# Altium integrated library BS_Altium_Lib.IntLib: 1016 symbols (part 1 of 8)
Pins are listed as number, name and electrical type; pins without a type are passive.

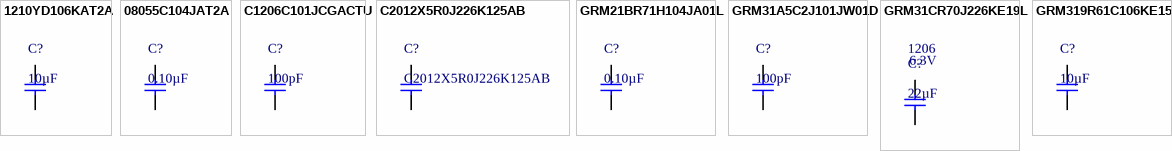
[diagram p0: symbols 1210YD106KAT2A to GRM319R61C106KE15D]

## 1210YD106KAT2A
designator C?, comment 10µF
CAP CER 10UF 16V X5R 1210; Manufacturer: AVX Corporation; Manufacturer Part Number: 1210YD106KAT2A; Tolerance: ±10%; Type: Standard X5R MLCCs; Voltage Rating DC: 16 VDC; Brand: AVX; Class: Class 2; Qualification: Commercial; Supplier 1: Digi-Key; RoHS: RoHS Compliant; Category: Capacitors; Stock 1: 11187; Pricing 1: 1=0.8, 10=0.588, 25=0.504, 50=0.4704, 100=0.4032, 250=0.3696, 500=0.3192 (USD); Packaging: Cut Tape (CT); Part Status: Active; Capacitance: 10µF; Voltage - Rated: 16V; Temperature Coefficient: X5R; Operating Temperature: -55°C ~ 85°C; Features: -; Ratings: -; Applications: General Purpose; Failure Rate: *; Mounting Type: Surface Mount, MLCC; Package / Case: 1210 (3225 Metric); Size / Dimension: 0.126" L x 0.098" W (3.20mm x 2.50mm); Height - Seated (Max): -; Thickness (Max): 0.110" (2.79mm); Lead Spacing: -; Lead Style: -; ComponentLink1URL: http://datasheets.avx.com/cx5r.pdf; ComponentLink1Description: http://datasheets.avx.com/cx5r.pdf; Supplier 2: Mouser; Stock 2: 1500; Pricing 2: 1=0.790, 50=0.780, 100=0.390, 500=0.353, 1000=0.240 (USD); Height: 2.79 mm; Length: 3.2 mm; Product: General Type MLCCs; Series: 1210; Termination Style: SMD/SMT; Width: 2.5 mm; Case Code - in: 1210; Case Code - mm: 3225; Dielectric: X5R; Maximum Operating Temperature: + 85 C; Minimum Operating Temperature: - 55 C; Standard Pack Qty: 1000; RoHS - Mouser: E; Minimum Order Quantity: 1; Reeling: True; ComponentLink2URL: http://www.mouser.com/ds/2/40/cx5r-776519.pdf; ComponentLink2Description: http://www.mouser.com/ds/2/40/cx5r-776519.pdf; Supplier Part Number 1: 478-1629-1-ND; Supplier Part Number 2: 581-1210YD106K
footprint C 1210
pins: 1, 2

## 08055C104JAT2A
designator C?, comment 0.10µF
CAP CER 0.1UF 50V X7R 0805; Manufacturer: AVX Corporation; Manufacturer Part Number: 08055C104JAT2A; Tolerance: ±5%; Type: X7R MLC Capacitors; Voltage Rating DC: 50 VDC; Brand: AVX; Capacitance - nF: 100 nF; Capacitance - pF: 100000 pF; Class: Class 2; Qualification: Commercial; Supplier 1: Digi-Key; RoHS: RoHS Compliant; Category: Capacitors; Stock 1: 534926; Pricing 1: 1=0.1, 10=0.062, 25=0.0448, 50=0.0336, 100=0.0274, 250=0.02296, 500=0.0196, 1000=0.0154 (USD); Packaging: Cut Tape (CT); Part Status: Active; Capacitance: 0.10µF; Voltage - Rated: 50V; Temperature Coefficient: X7R; Operating Temperature: -55°C ~ 125°C; Features: -; Ratings: -; Applications: General Purpose; Failure Rate: *; Mounting Type: Surface Mount, MLCC; Package / Case: 0805 (2012 Metric); Size / Dimension: 0.079" L x 0.049" W (2.01mm x 1.25mm); Height - Seated (Max): -; Thickness (Max): 0.037" (0.94mm); Lead Spacing: -; Lead Style: -; ComponentLink1URL: http://datasheets.avx.com/X7RDielectric.pdf; ComponentLink1Description: http://datasheets.avx.com/X7RDielectric.pdf; Supplier 2: Mouser; Stock 2: 129850; Pricing 2: 1=0.100, 50=0.033, 100=0.022, 500=0.019, 1000=0.015, 4000=0.011, 8000=0.010 (USD); Height: 0.5 mm; Length: 2 mm; Product: General Type MLCCs; Termination Style: SMD/SMT; Width: 1.2 mm; Case Code - in: 0805; Case Code - mm: 2012; Dielectric: X7R; Maximum Operating Temperature: + 125 C; Minimum Operating Temperature: - 55 C; Standard Pack Qty: 4000; Termination: -; RoHS - Mouser: E; Minimum Order Quantity: 1; Reeling: True; ComponentLink2URL: http://www.mouser.com/ds/2/40/X7RDielectric-777024.pdf; ComponentLink2Description: http://www.mouser.com/ds/2/40/X7RDielectric-777024.pdf; Supplier Part Number 1: 478-3352-1-ND; Supplier Part Number 2: 581-08055C104J
footprint C 0805 (Chip Capacitor, 2-Leads, Body 2.0x1.3mm, IPC Medium Density)
pins: 1, 2

## C1206C101JCGACTU
designator C?, comment 100pF
CAP CER 100PF 500V NP0 1206; Manufacturer: Kemet; Manufacturer Part Number: C1206C101JCGACTU; Tolerance: ±5%; Temperature Coefficient: C0G, NP0; Type: High Voltage C0G Dielectric, 500-3,000 VDC (Commercial & Automotive Grade); Voltage Rating DC: 500 VDC; Capacitance - nF: 0.1 nF; Class: Class 1; Dielectric: C0G (NP0); Supplier 1: Digi-Key; RoHS: RoHS Compliant; Category: Capacitors; Stock 1: 1581; Pricing 1: 1=0.35, 10=0.288, 50=0.162, 100=0.144, 250=0.108, 500=0.0954, 1000=0.0846 (USD); Packaging: Cut Tape (CT); Part Status: Active; Capacitance: 100pF; Voltage - Rated: 500V; Operating Temperature: -55°C ~ 125°C; Features: High Voltage; Ratings: -; Applications: SMPS Filtering; Failure Rate: -; Mounting Type: Surface Mount, MLCC; Package / Case: 1206 (3216 Metric); Size / Dimension: 0.126" L x 0.063" W (3.20mm x 1.60mm); Height - Seated (Max): -; Thickness (Max): 0.053" (1.35mm); Lead Spacing: -; Lead Style: -; ComponentLink1URL: http://www.kemet.com/docfinder?Partnumber=C1206C101JCGACTU; ComponentLink1Description: http://www.kemet.com/docfinder?Partnumber=C1206C101JCGACTU; Supplier 2: Mouser; Stock 2: 3717; Pricing 2: 1=0.350, 10=0.162, 100=0.108, 500=0.095, 1000=0.084, 2500=0.066, 10000=0.059, 25000=0.057, 50000=0.054 (USD); Diameter: -; Height: -; Length: 3.2 mm; Product: General Type MLCCs; Series: High Voltage C0G Dielectric; Termination Style: SMD/SMT; Voltage Rating AC: -; Width: 1.6 mm; Brand: Kemet; Case Code - in: 1206; Case Code - mm: 3216; Maximum Operating Temperature: + 125 C; Minimum Operating Temperature: - 55 C; Standard Pack Qty: 2500; RoHS - Mouser: Y; Minimum Order Quantity: 1; Reeling: True; ComponentLink2URL: http://www.mouser.com/ds/2/212/KEM_C1009_C0G_HV_SMD-515673.pdf; ComponentLink2Description: http://www.mouser.com/ds/2/212/KEM_C1009_C0G_HV_SMD-515673.pdf; Supplier Part Number 1: 399-7073-1-ND; Supplier Part Number 2: 80-C1206C101JCG
footprint C 1206
pins: 1, 2

## C2012X5R0J226K125AB
designator C?
Multilayer Ceramic Capacitors MLCC - SMD/SMT 0805 6.3V 22uF X5R 10% T: 1.25mm; Manufacturer: TDK; Type: Multilayer Ceramic Chip Capacitor; Voltage Rating DC: 6.3 VDC; Supplier 1: Mouser; Supplier Part Number 1: 810-C2012X5R0J226K-3; Manufacturer Part Number: C2012X5R0J226K125AB; RoHS: RoHS Compliant; Category: Multilayer Ceramic Capacitors MLCC - SMD/SMT; Stock 1: 19091; Pricing 1: 1=0.830, 10=0.589, 100=0.388, 500=0.287, 1000=0.244, 2000=0.200 (USD); Capacitance: 22 uF; Height: 1.25 mm; Length: 2 mm; Package: 0805 (2012 metric); Packaging: Cut Tape; Product: General Type MLCCs; Series: C; Termination Style: SMD/SMT; Tolerance: 10 %; Width: 1.25 mm; Brand: TDK; Case Code - in: 0805; Case Code - mm: 2012; Dielectric: X5R; Maximum Operating Temperature: + 85 C; Minimum Operating Temperature: - 55 C; Product Type: Ceramic Capacitors; Standard Pack Qty: 2000; Subcategory: Capacitors; RoHS - Mouser: Y; Minimum Order Quantity: 1; Reeling: True; ComponentLink1URL: https://www.mouser.com/datasheet/2/400/lcc_commercial_general_en-837201.pdf; ComponentLink1Description: https://www.mouser.com/datasheet/2/400/lcc_commercial_general_en-837201.pdf
footprint C 0805 (Chip Capacitor, 2-Leads, Body 2.0x1.3mm, IPC Medium Density)
pins: 1, 2

## GRM21BR71H104JA01L
designator C?, comment 0.10µF
CAP CER 0.1UF 50V X7R 0805; Manufacturer: Murata Electronics North America; Manufacturer Part Number: GRM21BR71H104JA01L; Tolerance: ±5%; Type: General Purpose MLCC; Voltage Rating DC: 50 VDC; Brand: Murata Electronics; Capacitance - nF: 100 nF; Capacitance - pF: 100000 pF; Qualification: Commercial; Supplier 1: Digi-Key; Supplier Part Number 1: 490-10782-1-ND; RoHS: RoHS Compliant; Category: Capacitors; Stock 1: 4029; Pricing 1: 1=0.16, 10=0.113, 50=0.065, 100=0.0537, 250=0.0452, 500=0.03786, 1000=0.03108 (USD); Packaging: Cut Tape (CT); Part Status: Active; Capacitance: 0.10µF; Voltage - Rated: 50V; Temperature Coefficient: X7R; Operating Temperature: -55°C ~ 125°C; Features: -; Ratings: -; Applications: General Purpose; Failure Rate: *; Mounting Type: Surface Mount, MLCC; Package / Case: 0805 (2012 Metric); Size / Dimension: 0.079" L x 0.049" W (2.00mm x 1.25mm); Height - Seated (Max): -; Thickness (Max): 0.053" (1.35mm); Lead Spacing: -; Lead Style: -; ComponentLink1URL: http://www.murata.com/~/media/webrenewal/support/library/catalog/products/capacitor/mlcc/c02e.pdf; ComponentLink1Description: http://www.murata.com/~/media/webrenewal/support/library/catalog/products/capacitor/mlcc/c02e.pdf; Supplier 2: Mouser; Supplier Part Number 2: 81-GRM21BR71H104JA01; Stock 2: 2452; Pricing 2: 1=0.160, 10=0.065, 100=0.045, 500=0.037, 1000=0.031, 3000=0.024, 9000=0.021, 24000=0.020, 45000=0.019 (USD); Height: 1.25 mm; Length: 2 mm; Product: General Type MLCCs; Series: GRM; Termination Style: SMD/SMT; Width: 1.25 mm; Case Code - in: 0805; Case Code - mm: 2012; Dielectric: X7R; Maximum Operating Temperature: + 125 C; Minimum Operating Temperature: - 55 C; Standard Pack Qty: 3000; RoHS - Mouser: Y; Minimum Order Quantity: 1; Reeling: True
footprint C 0805 (Chip Capacitor, 2-Leads, Body 2.0x1.3mm, IPC Medium Density)
pins: 1, 2

## GRM31A5C2J101JW01D
designator C?, comment 100pF
CAP CER 100PF 630V NP0 1206; Manufacturer: Murata Electronics North America; Manufacturer Part Number: GRM31A5C2J101JW01D; Tolerance: ±5%; Temperature Coefficient: C0G, NP0; Type: General Purpose MLCC; Voltage Rating DC: 630 VDC; Brand: Murata Electronics; Capacitance - nF: 0.1 nF; Dielectric: C0G (NP0); Qualification: Commercial; Supplier 1: Digi-Key; Supplier Part Number 1: 490-5273-1-ND; RoHS: RoHS Compliant; Category: Capacitors; Stock 1: 17975; Pricing 1: 1=0.24, 10=0.165, 50=0.1, 100=0.084, 250=0.068, 500=0.06, 1000=0.051 (USD); Packaging: Cut Tape (CT); Part Status: Active; Capacitance: 100pF; Voltage - Rated: 630V; Operating Temperature: -55°C ~ 125°C; Features: -; Ratings: -; Applications: General Purpose; Failure Rate: *; Mounting Type: Surface Mount, MLCC; Package / Case: 1206 (3216 Metric); Size / Dimension: 0.126" L x 0.063" W (3.20mm x 1.60mm); Height - Seated (Max): -; Thickness (Max): 0.039" (1.00mm); Lead Spacing: -; Lead Style: -; ComponentLink1URL: http://www.murata.com/~/media/webrenewal/support/library/catalog/products/capacitor/mlcc/c02e.pdf; ComponentLink1Description: http://www.murata.com/~/media/webrenewal/support/library/catalog/products/capacitor/mlcc/c02e.pdf; Supplier 2: Mouser; Supplier Part Number 2: 81-GRM31A5C2J101JW01; Stock 2: 72816; Pricing 2: 1=0.240, 10=0.100, 100=0.068, 500=0.060, 4000=0.060 (USD); Height: 1 mm; Length: 3.2 mm; Product: General Type MLCCs; Series: GRM; Termination Style: SMD/SMT; Width: 1.6 mm; Case Code - in: 1206; Case Code - mm: 3216; Maximum Operating Temperature: + 125 C; Minimum Operating Temperature: - 55 C; Standard Pack Qty: 4000; RoHS - Mouser: Y; Minimum Order Quantity: 1; Reeling: True
footprint C 1206
pins: 1, 2

## GRM31CR70J226KE19L
designator C?, comment 22µF  Voltage - Rated: 6.3V  Package: 1206
CAP CER 22UF 6.3V X7R 1206; Manufacturer: Murata Electronics North America; Manufacturer Part Number: GRM31CR70J226KE19L; Tolerance: ±10%; Supplier 1: Digi-Key; Supplier Part Number 1: 490-6515-1-ND; RoHS: RoHS Compliant; Category: Capacitors; Stock 1: 248; Pricing 1: 1=0.5, 10=0.356, 25=0.3044, 50=0.2696, 100=0.2347, 250=0.19996, 500=0.17388, 1000=0.1478 (USD); Packaging: Cut Tape (CT); Part Status: Active; Capacitance: 22µF; Temperature Coefficient: X7R; Operating Temperature: -55°C ~ 125°C; Features: -; Ratings: -; Applications: General Purpose; Mounting Type: Surface Mount, MLCC; Size / Dimension: 0.126" L x 0.063" W (3.20mm x 1.60mm); Height - Seated (Max): -; Thickness (Max): 0.071" (1.80mm); Lead Spacing: -; Lead Style: -; ComponentLink1URL: http://www.murata.com/~/media/webrenewal/support/library/catalog/products/capacitor/mlcc/c02e.ashx; ComponentLink1Description: http://www.murata.com/~/media/webrenewal/support/library/catalog/products/capacitor/mlcc/c02e.ashx
footprint C 1206
pins: 1, 2

## GRM319R61C106KE15D
designator C?, comment 10µF
CAP CER 10UF 16V X5R 1206; Manufacturer: Murata Electronics North America; Manufacturer Part Number: GRM319R61C106KE15D; Tolerance: ±10%; Type: General Purpose MLCC; Voltage Rating DC: 16 VDC; Brand: Murata Electronics; Supplier 1: Digi-Key; Supplier Part Number 1: 490-6494-1-ND; RoHS: RoHS Compliant; Category: Capacitors; Stock 1: 16378; Pricing 1: 1=0.24, 10=0.165, 50=0.1, 100=0.084 (USD); Packaging: Cut Tape (CT); Part Status: Active; Capacitance: 10µF; Voltage - Rated: 16V; Temperature Coefficient: X5R; Operating Temperature: -55°C ~ 85°C; Features: -; Ratings: -; Applications: General Purpose; Failure Rate: *; Mounting Type: Surface Mount, MLCC; Package / Case: 1206 (3216 Metric); Size / Dimension: 0.126" L x 0.063" W (3.20mm x 1.60mm); Height - Seated (Max): -; Thickness (Max): 0.037" (0.95mm); Lead Spacing: -; Lead Style: -; ComponentLink1URL: http://www.murata.com/~/media/webrenewal/support/library/catalog/products/capacitor/mlcc/c02e.pdf; ComponentLink1Description: http://www.murata.com/~/media/webrenewal/support/library/catalog/products/capacitor/mlcc/c02e.pdf; Supplier 2: Mouser; Supplier Part Number 2: 81-GRM319R61C106KE5D; Stock 2: 5402; Pricing 2: 1=0.240, 10=0.100, 100=0.084, 500=0.072, 1000=0.059, 4000=0.040 (USD); Height: 0.85 mm; Length: 3.2 mm; Product: General Type MLCCs; Series: GRM; Termination Style: SMD/SMT; Width: 1.6 mm; Case Code - in: 1206; Case Code - mm: 3216; Dielectric: X5R; Maximum Operating Temperature: + 85 C; Minimum Operating Temperature: - 55 C; Standard Pack Qty: 4000; RoHS - Mouser: Y; Minimum Order Quantity: 1; Reeling: True
footprint C 1206
pins: 1, 2


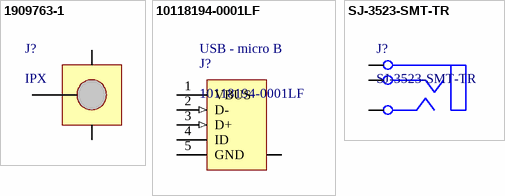
[diagram p1: symbols 1909763-1 to SJ-3523-SMT-TR]

## 1909763-1
designator J?, comment IPX
CONN UMCC JACK STR 50OHM IPX SMD; Manufacturer: TE Connectivity AMP Connectors; Manufacturer Part Number: 1909763-1; Connector Style: Ultra Miniature Coaxial; Connector Type: Jack, Male Pin; Contact Termination: Solder; Frequency - Max: 6GHz; Includes: 1 pc - 1 Connector; Body Material: Copper Alloy; Body Finish: Gold; Dielectric Material: Liquid Crystal Polymer (LCP); Voltage Rating: 60V; Mating Cycles: 30; Insertion Loss: 0.24dB; Supplier 1: Digi-Key; Supplier Part Number 1: A118077CT-ND; RoHS: RoHS Compliant; Category: Connectors, Interconnects; Stock 1: 68594; Pricing 1: 1=0.54, 10=0.508, 25=0.4572, 50=0.4066, 100=0.3896, 250=0.35576, 500=0.3388, 1000=0.27951, 2500=0.2541 (USD); Packaging: Cut Tape (CT); Part Status: Active; Shield Termination: Solder; Impedance: 50 Ohm; Mounting Type: Surface Mount; Mounting Feature: -; Cable Group: -; Fastening Type: Snap-On; Features: -; Housing Color: Ivory; Ingress Protection: -; Center Contact Plating: Gold; Operating Temperature: -40°C ~ 90°C; Center Contact Material: Copper Alloy; ComponentLink1URL: http://www.te.com/commerce/DocumentDelivery/DDEController?Action=srchrtrv&DocNm=1909763&DocType=Customer+Drawing&DocLang=English; ComponentLink1Description: http://www.te.com/commerce/DocumentDelivery/DDEController?Action=srchrtrv&DocNm=1909763&DocType=Customer+Drawing&DocLang=English
footprint CONN/IPX/SMD
pins: 1 SIG, 2 G1, 3 G2

## 10118194-0001LF
designator J?  Connector Type: USB - micro B
CONN USB MICRO B RECPT SMT R/A; Manufacturer: Amphenol FCI; Number of Contacts: 5; Gender: Receptacle; Specifications: USB 2.0; Number of Ports: 1; Current Rating: 1.8A per Contact; Voltage - Rated: 100VAC; Mating Cycles: 10000; Shielding: Shielded; Material Flammability Rating: UL94 V-0; Supplier 1: Digi-Key; Supplier Part Number 1: 609-4618-1-ND; Manufacturer Part Number: 10118194-0001LF; RoHS: RoHS Compliant; Category: Connectors, Interconnects; Stock 1: 275678; Pricing 1: 1=0.46, 10=0.437, 25=0.3744, 50=0.318, 100=0.3056, 250=0.27444, 500=0.26196 (USD); Packaging: Cut Tape (CT); Part Status: Active; Mounting Type: Surface Mount, Right Angle; Through Hole; Mounting Feature: Horizontal; Termination: Solder; Features: Solder Retention; Ingress Protection: -; Operating Temperature: -30°C ~ 80°C; Contact Finish: Gold; Shell/Shielding Material: Steel, Stainless; Insulation Color: Black; ComponentLink1URL: http://portal.fciconnect.com/Comergent//fci/drawing/10118194.pdf; ComponentLink1Description: http://portal.fciconnect.com/Comergent//fci/drawing/10118194.pdf
footprint CONN/USB/10118194-0001LF (USB - micro B USB 2.0 Receptacle Connector 5 Position Surface Mount, Right Angle, Horizontal)
pins: 1 VBUS (power) "Power", 2 D- (in) "-DATA", 3 D+ (in) "+DATA", 4 ID, 5 GND (power) "Ground", SHLD "Shield"

## SJ-3523-SMT-TR
designator J?
CONN JACK STEREO 3.5MM SMD R/A; Manufacturer: CUI Inc.; Connector Type: Phone Jack; Gender: Female; Industry Recognized Mating Diameter: 3.50mm (0.141", 1/8", Mini Plug) - Headphone; Actual Diameter: 0.142" (3.60mm); Number of Positions/Contacts: 3 Conductors, 3 Contacts; Internal Switch(s): Does Not Contain Switch; Shielding: Unshielded; Voltage - Rated: 12VDC; Current Rating: 1A; Mating Length/Depth: 0.551" (14.00mm); Body Color: Black; Includes: 1 pc - 1 Connector; Supplier 1: Digi-Key; Supplier Part Number 1: CP-3523SJCT-ND; Manufacturer Part Number: SJ-3523-SMT-TR; RoHS: RoHS Compliant; Category: Connectors, Interconnects; Stock 1: 26601; Pricing 1: 1=1.02, 10=0.9, 25=0.8476, 50=0.8122, 100=0.7768, 250=0.7062, 500=0.63558 (USD); Packaging: Cut Tape (CT); Part Status: Active; Signal Lines: Stereo; Mounting Type: Surface Mount, Right Angle; Termination: Solder; Features: Board Guide; Insulation Color: -; Contact Material - Plating: Silver; Body Material: -; Housing Material: Polyamide (PA6T), Nylon 6T; Contact Material: Brass; Copper Alloy; Cable Opening: -; Panel Hole Size: -; Thread Size: -; Operating Temperature: -25°C ~ 85°C; ComponentLink1URL: http://www.cui.com/product/resource/digikeypdf/sj-352x-smt_series.pdf; ComponentLink1Description: http://www.cui.com/product/resource/digikeypdf/sj-352x-smt_series.pdf
footprint CONN/SJ-3523-SMT-TR (3.50mm (0.141", 1/8", Mini Plug) - Headphone Phone Jack Stereo Connector Solder)
pins: 1 sleeve, 2 tip, 3 ring


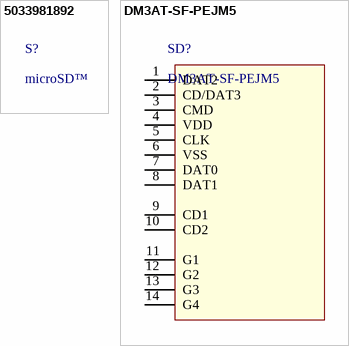
[diagram p2: symbols 5033981892 to DM3AT-SF-PEJM5]

## 5033981892
designator S?, comment microSD™
MICRO SD PUSH/PUSH SMALL 8C; Manufacturer: Molex, LLC; Manufacturer Part Number: 5033981892; Number of Positions: 9 (8 + 1); Connector Type: Connector and Ejector; Insertion, Removal Method: Push In, Push Out; Supplier 1: Digi-Key; Supplier Part Number 1: WM11190CT-ND; RoHS: RoHS Compliant; Category: Connectors, Interconnects; Stock 1: 5330; Pricing 1: 1=2.97, 10=2.853, 25=2.6152, 50=2.4962, 100=2.3773, 250=2.08016, 500=2.02072, 1000=1.72356 (USD); Packaging: Cut Tape (CT); Part Status: Active; Card Type: microSD™; Ejector Side: -; Mounting Type: Surface Mount, Right Angle; Features: Switch; Height Above Board: 0.050" (1.28mm); Mounting Feature: Normal, Standard - Top; Contact Finish: Gold; Contact Finish Thickness: 19.7µin (0.50µm); ComponentLink1URL: http://www.molex.com/pdm_docs/sd/5033981892_sd.pdf; ComponentLink1Description: http://www.molex.com/pdm_docs/sd/5033981892_sd.pdf

## DM3AT-SF-PEJM5
designator SD?
CONN MICRO SD CARD PUSH-PUSH R/A; Manufacturer: Hirose Electric Co Ltd; Card Type: Secure Digital - microSD™; Number of Positions: 10 (8 + 2); Connector Type: Connector and Ejector; Insertion, Removal Method: Push In, Push Out; Supplier 1: Digi-Key; Supplier Part Number 1: HR1964CT-ND; Manufacturer Part Number: DM3AT-SF-PEJM5; RoHS: RoHS Compliant; Category: Connectors, Interconnects; Stock 1: 25778; Pricing 1: 1=2.88, 10=2.614, 25=2.454, 50=2.3474, 100=2.2407, 250=2.02732, 500=1.86726 (USD); Packaging: Cut Tape (CT); Part Status: Active; Ejector Side: -; Mounting Type: Surface Mount, Right Angle; Features: Switch; Height Above Board: 0.066" (1.68mm); Mounting Feature: Normal, Standard - Top; Contact Finish: Gold; Contact Finish Thickness: -; ComponentLink1URL: https://www.hirose.com/product/download/?distributor=digikey&type=2d&lang=en&num=DM3AT-SF-PEJM7; ComponentLink1Description: https://www.hirose.com/product/download/?distributor=digikey&type=2d&lang=en&num=DM3AT-SF-PEJM7
footprint CON/SD/Micro/DM3AT-SF-PEJM5
pins: 1 DAT2, 2 CD/DAT3, 3 CMD, 4 VDD, 5 CLK, 6 VSS, 7 DAT0, 8 DAT1, 9 CD1, 10 CD2, 11 G1, 12 G2, 13 G3, 14 G4


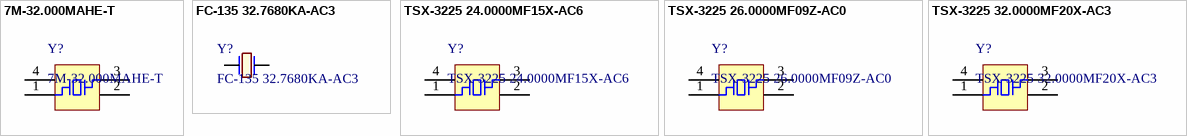
[diagram p3: symbols 7M-32.000MAHE-T to TSX-3225 32.0000MF20X-AC3]

## 7M-32.000MAHE-T
designator Y?
CRYSTAL 32.0000MHZ 12PF SMD; Manufacturer: TXC CORPORATION; Frequency: 32MHz; Frequency Stability: ±30ppm; ESR (Equivalent Series Resistance): 60 Ohm; Operating Mode: Fundamental; Supplier 1: Digi-Key; Supplier Part Number 1: 887-1789-1-ND; Manufacturer Part Number: 7M-32.000MAHE-T; RoHS: RoHS Compliant; Category: Crystals, Oscillators, Resonators; Stock 1: 5976; Pricing 1: 1=1, 10=0.886, 50=0.8278, 100=0.7315, 500=0.693, 1000=0.5775 (USD); Packaging: Cut Tape (CT); Part Status: Active; Type: MHz Crystal; Frequency Tolerance: ±30ppm; Load Capacitance: 12pF; Operating Temperature: -40°C ~ 85°C; Ratings: -; Mounting Type: Surface Mount; Size / Dimension: 0.126" L x 0.098" W (3.20mm x 2.50mm); Height - Seated (Max): 0.031" (0.80mm); ComponentLink1URL: http://www.txccorp.com/download/products/quartz_crystals/2015TXC_7M_17.pdf; ComponentLink1Description: http://www.txccorp.com/download/products/quartz_crystals/2015TXC_7M_17.pdf; Package: 4-SMD, No Lead
footprint Crystal 4-SMD 32x25
pins: 1 XTAL, 2 GND, 3 XTAL, 4 GND

## FC-135 32.7680KA-AC3
designator Y?
CRYSTAL 32.7680 KHZ 9.0PF SMD; Manufacturer: EPSON; Frequency: 32.768kHz; Frequency Tolerance: ±20ppm; Load Capacitance: 9pF; ESR (Equivalent Series Resistance): 70 kOhm; Operating Mode: Fundamental; Supplier 1: Digi-Key; Supplier Part Number 1: SER4085CT-ND; Manufacturer Part Number: FC-135 32.7680KA-AC3; RoHS: RoHS Compliant; Category: Crystals, Oscillators, Resonators; Stock 1: 879; Pricing 1: 1=0.77, 10=0.683, 50=0.6386, 100=0.5643 (USD); Packaging: Cut Tape (CT); Part Status: Active; Type: kHz Crystal (Tuning Fork); Frequency Stability: -; Operating Temperature: -40°C ~ 85°C; Ratings: -; Mounting Type: Surface Mount; Size / Dimension: 0.126" L x 0.061" W (3.20mm x 1.50mm); Height - Seated (Max): 0.035" (0.90mm); ComponentLink1URL: https://support.epson.biz/td/api/doc_check.php?dl=brief_FC-135R_en.pdf; ComponentLink1Description: https://support.epson.biz/td/api/doc_check.php?dl=brief_FC-135R_en.pdf; Package: 2-SMD, No Lead
footprint Crystal 2-SMD 32x15 (Crystal 3.2mm x 1.5mm SMD)
pins: 1, 2

## TSX-3225 24.0000MF15X-AC6
designator Y?
CRYSTAL 24.00 MHZ 9.0PF SMD; Manufacturer: EPSON; Frequency: 24MHz; Frequency Stability: ±15ppm; Frequency Tolerance: ±10ppm; Load Capacitance: 9pF; ESR (Equivalent Series Resistance): 40 Ohm; Operating Mode: Fundamental; Supplier 1: Digi-Key; Supplier Part Number 1: SER4180CT-ND; Manufacturer Part Number: TSX-3225 24.0000MF15X-AC6; RoHS: RoHS Compliant; Category: Crystals, Oscillators, Resonators; Stock 1: 98550; Pricing 1: 1=0.56, 10=0.468, 50=0.4208, 100=0.374, 500=0.3553, 1000=0.2992 (USD); Packaging: Cut Tape (CT); Part Status: Active; Type: MHz Crystal; Operating Temperature: -40°C ~ 85°C; Ratings: -; Mounting Type: Surface Mount; Size / Dimension: 0.126" L x 0.098" W (3.20mm x 2.50mm); Height - Seated (Max): 0.024" (0.60mm); ComponentLink1URL: https://support.epson.biz/td/api/doc_check.php?dl=brief_FA-238V_en.pdf; ComponentLink1Description: https://support.epson.biz/td/api/doc_check.php?dl=brief_FA-238V_en.pdf; Package: 4-SMD, No Lead
footprint Crystal 4-SMD 32x25
pins: 1 XTAL, 2 GND, 3 XTAL, 4 GND

## TSX-3225 26.0000MF09Z-AC0
designator Y?
CRYSTAL 26.00 MHZ 9.0PF SMD; Manufacturer: EPSON; Frequency: 26MHz; Frequency Stability: ±9ppm; Frequency Tolerance: ±10ppm; Load Capacitance: 9pF; ESR (Equivalent Series Resistance): 40 Ohm; Operating Mode: Fundamental; Supplier 1: Digi-Key; Supplier Part Number 1: SER4105CT-ND; Manufacturer Part Number: TSX-3225 26.0000MF09Z-AC0; RoHS: RoHS Compliant; Category: Crystals, Oscillators, Resonators; Stock 1: 31245; Pricing 1: 1=0.56, 10=0.468, 50=0.4208, 100=0.374, 500=0.3553 (USD); Packaging: Cut Tape (CT); Part Status: Active; Type: MHz Crystal; Operating Temperature: -20°C ~ 75°C; Ratings: -; Mounting Type: Surface Mount; Size / Dimension: 0.126" L x 0.098" W (3.20mm x 2.50mm); Height - Seated (Max): 0.024" (0.60mm); ComponentLink1URL: https://support.epson.biz/td/api/doc_check.php?dl=brief_FA-238V_en.pdf; ComponentLink1Description: https://support.epson.biz/td/api/doc_check.php?dl=brief_FA-238V_en.pdf; Package: 4-SMD, No Lead
footprint Crystal 4-SMD 32x25
pins: 1 XTAL, 2 GND, 3 XTAL, 4 GND

## TSX-3225 32.0000MF20X-AC3
designator Y?
CRYSTAL 32.00 MHZ 9.0PF SMD; Manufacturer: EPSON; Frequency: 32MHz; Frequency Stability: ±20ppm; Frequency Tolerance: ±10ppm; Load Capacitance: 9pF; ESR (Equivalent Series Resistance): 40 Ohm; Operating Mode: Fundamental; Supplier 1: Digi-Key; Supplier Part Number 1: TSX-3225 32.0000MF20X-AC3-ND; Manufacturer Part Number: TSX-3225 32.0000MF20X-AC3; RoHS: RoHS Compliant; Category: Crystals, Oscillators, Resonators; Stock 1: 0; Pricing 1: 250=0.34 (USD); Packaging: Tape & Reel (TR); Part Status: Active; Type: MHz Crystal; Operating Temperature: -40°C ~ 85°C; Ratings: -; Mounting Type: Surface Mount; Size / Dimension: 0.126" L x 0.098" W (3.20mm x 2.50mm); Height - Seated (Max): 0.024" (0.60mm); ComponentLink1URL: https://support.epson.biz/td/api/doc_check.php?dl=brief_FA-238V_en.pdf; ComponentLink1Description: https://support.epson.biz/td/api/doc_check.php?dl=brief_FA-238V_en.pdf; Package: 4-SMD, No Lead
footprint Crystal 4-SMD 32x25
pins: 1 XTAL, 2 GND, 3 XTAL, 4 GND


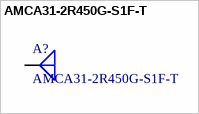
[diagram p4: symbol AMCA31-2R450G-S1F-T]

## AMCA31-2R450G-S1F-T
designator A?
ANTENNA CHIP DIELECTRIC 2450MHZ; Manufacturer: Abracon LLC; Frequency Group: UHF (2 GHz ~ 3 GHz); Frequency (Center/Band): 2.4GHz; Frequency Range: 2.405GHz ~ 2.495GHz; VSWR: 2; Gain: 0.5dBi; Power - Max: 3W; Supplier 1: Digi-Key; Supplier Part Number 1: 535-12386-1-ND; Manufacturer Part Number: AMCA31-2R450G-S1F-T; RoHS: RoHS Compliant; Category: RF/IF and RFID; Stock 1: 3494; Pricing 1: 1=0.48, 10=0.408, 25=0.3568, 100=0.3059, 250=0.26512, 500=0.22434 (USD); Packaging: Cut Tape (CT); Part Status: Active; Antenna Type: Chip; Return Loss: -; Features: -; Termination: Solder; Ingress Protection: -; Mounting Type: Surface Mount; Height (Max): 0.047" (1.20mm); Applications: Bluetooth, WLAN; ComponentLink1URL: http://www.abracon.com/chip-antenna/AMCA31-2R450G-S1F-T.pdf; ComponentLink1Description: http://www.abracon.com/chip-antenna/AMCA31-2R450G-S1F-T.pdf
footprint RF ANT 32x16
pins: 1, 2 hidden


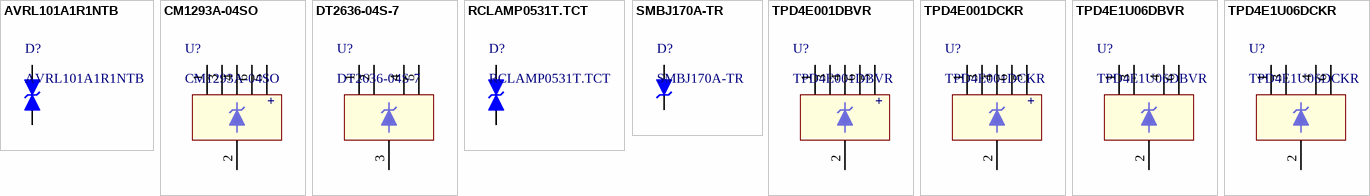
[diagram p5: symbols AVRL101A1R1NTB to TPD4E1U06DCKR]

## AVRL101A1R1NTB
designator D?
VARISTOR 39V 0402; Manufacturer: TDK Corporation; Type: Zener; Voltage - Reverse Standoff (Typ): 5V (Max); Voltage - Breakdown (Min): 6V; Voltage - Clamping (Max) @ Ipp: 20V; Current - Peak Pulse (10/1000µs): 4A (8/20µs); Power - Peak Pulse: 80W; Power Line Protection: No; Capacitance @ Frequency: 1.1pF @ 1MHz; Supplier 1: Digi-Key; Supplier Part Number 1: 445-2561-1-ND; Manufacturer Part Number: AVRL101A1R1NTB; RoHS: RoHS Compliant; Category: Circuit Protection; Stock 1: 27666; Pricing 1: 1=0.97, 10=0.845, 25=0.7488, 100=0.6521, 250=0.56752, 500=0.483, 1000=0.3864 (USD); Packaging: Cut Tape (CT); Part Status: Active; Applications: General Purpose; Operating Temperature: -55°C ~ 125°C (TJ); Mounting Type: Surface Mount; ComponentLink1URL: https://product.tdk.com/info/en/catalog/datasheets/vpd_varistors_avr_en.pdf; ComponentLink1Description: https://product.tdk.com/info/en/catalog/datasheets/vpd_varistors_avr_en.pdf; Package: 0402 (1106 Metric)
footprint D 0402 (1106)
footprint V 0402 (1005)
pins: 1 D1, 2 D2

## CM1293A-04SO
designator U?
TVS DIODE 3.3VWM 9.9VC SC74; Manufacturer: ON Semiconductor; Voltage - Reverse Standoff (Typ): 3.3V; Voltage - Clamping (Max) @ Ipp: 9.9V (Typ); Current - Peak Pulse (10/1000µs): 1A (8/20µs); Power Line Protection: Yes; Supplier 1: Digi-Key; Supplier Part Number 1: CM1293A-04SOOSCT-ND; Manufacturer Part Number: CM1293A-04SO; RoHS: RoHS Compliant; Category: Circuit Protection; Stock 1: 32324; Pricing 1: 1=0.43, 10=0.323, 100=0.1829, 500=0.12114, 1000=0.09287 (USD); Packaging: Cut Tape (CT); Part Status: Active; Type: Steering (Rail to Rail); Voltage - Breakdown (Min): -; Power - Peak Pulse: -; Applications: Automotive; Capacitance @ Frequency: -; Operating Temperature: -40°C ~ 85°C (TA); Mounting Type: Surface Mount; Supplier Device Package: SC-74; ComponentLink1URL: http://www.onsemi.com/pub_link/Collateral/CM1293A-04SO-D.PDF; ComponentLink1Description: http://www.onsemi.com/pub_link/Collateral/CM1293A-04SO-D.PDF; Package: SC-74, SOT-457
footprint SC-74 (SOT-457)
pins: 1 CH1 "ESD Channel", 2 VN "Negative Voltage Supply Rail", 3 CH2 "ESD Channel", 4 CH3 "ESD Channel", 5 VP "Positive Voltage Supply Rail", 6 CH4 "ESD Channel"
text: +

## DT2636-04S-7
designator U?
TVS DIODE 5.5VWM 9VC; Manufacturer: Diodes Incorporated; Voltage - Reverse Standoff (Typ): 5.5V (Max); Voltage - Breakdown (Min): 7V; Voltage - Clamping (Max) @ Ipp: 9V (Typ); Current - Peak Pulse (10/1000µs): 5A (8/20µs); Power - Peak Pulse: 60W; Power Line Protection: Yes; Capacitance @ Frequency: 0.75pF @ 1MHz; Supplier 1: Digi-Key; Supplier Part Number 1: DT2636-04S-7DICT-ND; Manufacturer Part Number: DT2636-04S-7; RoHS: RoHS Compliant; Category: Circuit Protection; Stock 1: 3001; Pricing 1: 1=0.39, 10=0.291, 100=0.1812, 500=0.12396, 1000=0.09536 (USD); Packaging: Cut Tape (CT); Part Status: Active; Type: Steering (Rail to Rail); Applications: HDMI; Operating Temperature: -55°C ~ 85°C (TA); Mounting Type: Surface Mount; Supplier Device Package: SOT-363; ComponentLink1URL: http://www.diodes.com/assets/Datasheets/DT2636-04S.pdf; ComponentLink1Description: http://www.diodes.com/assets/Datasheets/DT2636-04S.pdf; Package: 6-TSSOP, SC-88, SOT-363
footprint SOT-363-6 (SOT363 (SC-88, SC-70-6), 6-Leads, Body 2.2x2.2mm (max), Pitch 0.65mm, IPC Medium Density)
pins: 1 CH1 "ESD Channel", 2 CH2 "ESD Channel", 3 GND "Negative Voltage Supply Rail", 4 CH3 "ESD Channel", 5 CH4 "ESD Channel", 6 NC hidden

## RCLAMP0531T.TCT
designator D?
TVS DIODE 5VWM 20VC; Manufacturer: Semtech Corporation; Type: Zener; Voltage - Reverse Standoff (Typ): 5V (Max); Voltage - Breakdown (Min): 6V; Voltage - Clamping (Max) @ Ipp: 20V; Current - Peak Pulse (10/1000µs): 4A (8/20µs); Power - Peak Pulse: 80W; Power Line Protection: No; Capacitance @ Frequency: 0.5pF @ 1MHz; Supplier 1: Digi-Key; Supplier Part Number 1: RCLAMP0531TTCTCT-ND; Manufacturer Part Number: RCLAMP0531T.TCT; RoHS: RoHS Compliant; Category: Circuit Protection; Stock 1: 27666; Pricing 1: 1=0.97, 10=0.845, 25=0.7488, 100=0.6521, 250=0.56752, 500=0.483, 1000=0.3864 (USD); Packaging: Cut Tape (CT); Part Status: Active; Applications: General Purpose; Operating Temperature: -55°C ~ 125°C (TJ); Mounting Type: Surface Mount; Supplier Device Package: SLP1006P2T; ComponentLink1URL: http://www.semtech.com/images/datasheet/rclamp0531t.pdf; ComponentLink1Description: http://www.semtech.com/images/datasheet/rclamp0531t.pdf; Package: 0402 (1106 Metric)
footprint D 0402 (1106)
pins: 1 D1, 2 D2

## SMBJ170A-TR
designator D?
TVS DIODE 170VWM 353VC SMB; Manufacturer: STMicroelectronics; Type: Zener; Unidirectional Channels: 1; Voltage - Reverse Standoff (Typ): 170V; Voltage - Breakdown (Min): 189V; Voltage - Clamping (Max) @ Ipp: 353V; Current - Peak Pulse (10/1000µs): 11.3A (8/20µs); Power - Peak Pulse: 600W; Power Line Protection: No; Breakdown Voltage: 189 V; Clamping Voltage: 353 V; Peak Surge Current: 2.2 A; Pd - Power Dissipation: 600 W; Polarity: Unidirectional; Working Voltage: 170 V; Supplier 1: Digi-Key; Manufacturer Part Number: SMBJ170A-TR; RoHS: RoHS Compliant; Category: Circuit Protection; Stock 1: 20363; Pricing 1: 1=0.36, 10=0.29, 100=0.198, 500=0.1482, 1000=0.111 (USD); Packaging: Cut Tape (CT); Part Status: Active; Bidirectional Channels: -; Applications: General Purpose; Capacitance @ Frequency: -; Operating Temperature: -55°C ~ 150°C (TJ); Mounting Type: Surface Mount; Package / Case: DO-214AA, SMB; Supplier Device Package: SMB (DO-214AA); ComponentLink1URL: http://www.st.com/content/ccc/resource/technical/document/datasheet/19/78/91/39/07/cd/40/65/CD00001366.pdf/files/CD00001366.pdf/_jcr_content/translations/en.CD00001366.pdf; ComponentLink1Description: http://www.st.com/content/ccc/resource/technical/document/datasheet/19/78/91/39/07/cd/40/65/CD00001366.pdf/files/CD00001366.pdf/_jcr_content/translations/en.CD00001366.pdf; Supplier 2: Mouser; Stock 2: 5435; Pricing 2: 1=0.340, 10=0.266, 100=0.144, 1000=0.108, 2500=0.093, 10000=0.087, 25000=0.080, 50000=0.077, 100000=0.074 (USD); Height: 2.45 mm; Length: 4.6 mm; Operating Temperature Range: - 65 C to + 175 C; Series: SMBJ170; Termination Style: SMD/SMT; Width: 3.95 mm; Brand: STMicroelectronics; Mounting Style: SMD/SMT; Maximum Operating Temperature: + 150 C; Minimum Operating Temperature: - 55 C; Standard Pack Qty: 10000; Tradename: Transil; RoHS - Mouser: Y; Minimum Order Quantity: 1; Reeling: True; ComponentLink2URL: http://www.mouser.com/ds/2/389/smbj-955195.pdf; ComponentLink2Description: http://www.mouser.com/ds/2/389/smbj-955195.pdf; Supplier Part Number 1: 497-6511-1-ND; Supplier Part Number 2: 511-SMBJ170A-TR
footprint DO-214AA (SMB)
pins: 1 A, 2 K

## TPD4E001DBVR
designator U?
TVS DIODE 5.5VWM SOT23-6; Manufacturer: Texas Instruments; Voltage - Reverse Standoff (Typ): 5.5V (Max); Voltage - Breakdown (Min): 11V; Power - Peak Pulse: 100W; Power Line Protection: Yes; Supplier 1: Digi-Key; Supplier Part Number 1: 296-28203-1-ND; Manufacturer Part Number: TPD4E001DBVR; RoHS: RoHS Compliant; Category: Circuit Protection; Stock 1: 6722; Pricing 1: 1=0.66, 10=0.578, 100=0.443, 500=0.3502, 1000=0.28016 (USD); Packaging: Cut Tape (CT); Part Status: Active; Type: Steering (Rail to Rail); Voltage - Clamping (Max) @ Ipp: -; Current - Peak Pulse (10/1000µs): -; Applications: Ethernet; Capacitance @ Frequency: -; Operating Temperature: -40°C ~ 85°C (TA); Mounting Type: Surface Mount; Supplier Device Package: SOT-23-6; ComponentLink1URL: http://www.ti.com/lit/ds/symlink/tpd4e001.pdf; ComponentLink1Description: http://www.ti.com/lit/ds/symlink/tpd4e001.pdf; Package: SOT-23-6
footprint SOT-23-6 (SOT23, 6-Leads, Body 3.0x3.0mm (max), Pitch 0.95mm, IPC Medium Density)
pins: 1 CH1 "ESD Channel", 2 GND "Ground", 3 CH2 "ESD Channel", 4 CH3 "ESD Channel", 5 VCC "Power-supply input. Bypass VCC to GND with a 0.1-μF ceramic capacitor.", 6 CH4 "ESD Channel"
text: +

## TPD4E001DCKR
designator U?
TVS DIODE 5.5VWM SC70-6; Manufacturer: Texas Instruments; Voltage - Reverse Standoff (Typ): 5.5V (Max); Voltage - Breakdown (Min): 11V; Power - Peak Pulse: 100W; Power Line Protection: Yes; Supplier 1: Digi-Key; Supplier Part Number 1: 296-28779-1-ND; Manufacturer Part Number: TPD4E001DCKR; RoHS: RoHS Compliant; Category: Circuit Protection; Stock 1: 6132; Pricing 1: 1=0.66, 10=0.578, 100=0.443, 500=0.3502, 1000=0.28016 (USD); Packaging: Cut Tape (CT); Part Status: Active; Type: Steering (Rail to Rail); Voltage - Clamping (Max) @ Ipp: -; Current - Peak Pulse (10/1000µs): -; Applications: Ethernet; Capacitance @ Frequency: -; Operating Temperature: -40°C ~ 85°C (TA); Mounting Type: Surface Mount; Supplier Device Package: SC-70-6; ComponentLink1URL: http://www.ti.com/lit/ds/symlink/tpd4e001.pdf; ComponentLink1Description: http://www.ti.com/lit/ds/symlink/tpd4e001.pdf; Package: 6-TSSOP, SC-88, SOT-363
footprint SC-70-6
pins: 1 CH1 "ESD Channel", 2 GND "Ground", 3 CH2 "ESD Channel", 4 CH3 "ESD Channel", 5 VCC "Power-supply input. Bypass VCC to GND with a 0.1-μF ceramic capacitor.", 6 CH4 "ESD Channel"
text: +

## TPD4E1U06DBVR
designator U?
TVS DIODE 5.5VWM 15VC SOT23-6; Manufacturer: Texas Instruments; Voltage - Reverse Standoff (Typ): 5.5V (Max); Voltage - Breakdown (Min): 6.5V; Voltage - Clamping (Max) @ Ipp: 15V (Typ); Current - Peak Pulse (10/1000µs): 3A (8/20µs); Power - Peak Pulse: 45W; Power Line Protection: Yes; Supplier 1: Digi-Key; Supplier Part Number 1: 296-35965-1-ND; Manufacturer Part Number: TPD4E1U06DBVR; RoHS: RoHS Compliant; Category: Circuit Protection; Stock 1: 10970; Pricing 1: 1=0.41, 10=0.329, 100=0.2241, 500=0.1681, 1000=0.12607 (USD); Packaging: Cut Tape (CT); Part Status: Active; Type: Steering (Rail to Rail); Applications: Ethernet, HDMI; Capacitance @ Frequency: -; Operating Temperature: -40°C ~ 125°C (TA); Mounting Type: Surface Mount; Supplier Device Package: SOT-23-6; ComponentLink1URL: http://www.ti.com/lit/ds/symlink/tpd4e1u06.pdf; ComponentLink1Description: http://www.ti.com/lit/ds/symlink/tpd4e1u06.pdf; Package: SOT-23-6
footprint SOT-23-6 (SOT23, 6-Leads, Body 3.0x3.0mm (max), Pitch 0.95mm, IPC Medium Density)
pins: 1 CH1 "ESD Channel", 2 GND "Ground", 3 CH2 "ESD Channel", 4 CH3 "ESD Channel", 5 NC hidden, 6 CH4 "ESD Channel"

## TPD4E1U06DCKR
designator U?
TVS DIODE 5.5VWM 15VC SC70-6; Manufacturer: Texas Instruments; Voltage - Reverse Standoff (Typ): 5.5V (Max); Voltage - Breakdown (Min): 6.5V; Voltage - Clamping (Max) @ Ipp: 15V (Typ); Current - Peak Pulse (10/1000µs): 3A (8/20µs); Power - Peak Pulse: 45W; Power Line Protection: Yes; Supplier 1: Digi-Key; Supplier Part Number 1: 296-39347-1-ND; Manufacturer Part Number: TPD4E1U06DCKR; RoHS: RoHS Compliant; Category: Circuit Protection; Stock 1: 21848; Pricing 1: 1=0.41, 10=0.329, 100=0.2241, 500=0.1681, 1000=0.12607 (USD); Packaging: Cut Tape (CT); Part Status: Active; Type: Steering (Rail to Rail); Applications: Ethernet, HDMI; Capacitance @ Frequency: -; Operating Temperature: -40°C ~ 125°C (TA); Mounting Type: Surface Mount; Supplier Device Package: SC-70-6; ComponentLink1URL: http://www.ti.com/lit/ds/symlink/tpd4e1u06.pdf; ComponentLink1Description: http://www.ti.com/lit/ds/symlink/tpd4e1u06.pdf; Package: 6-TSSOP, SC-88, SOT-363
footprint SC-70-6 (SOT-363-6)
pins: 1 CH1 "ESD Channel", 2 GND "Ground", 3 CH2 "ESD Channel", 4 CH3 "ESD Channel", 5 NC hidden, 6 CH4 "ESD Channel"


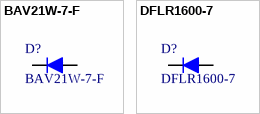
[diagram p6: symbols BAV21W-7-F to DFLR1600-7]

## BAV21W-7-F
designator D?
DIODE GEN PURP 200V 200MA SOD123; Manufacturer: Diodes Incorporated; Diode Type: Standard; Voltage - Forward (Vf) (Max) @ If: 1.25V @ 200mA; Speed: Small Signal =< 200mA (Io), Any Speed; Reverse Recovery Time (trr): 50ns; Current - Reverse Leakage @ Vr: 100nA @ 200V; Capacitance @ Vr, F: 5pF @ 0V, 1MHz; Configuration: Single; Type: Switching Diode; Max Surge Current: 2.5 A; Recovery Time: 50 ns; If - Forward Current: 0.2 A; Ir - Reverse Current: 15 uA; Vf - Forward Voltage: 1.25 V; Supplier 1: Digi-Key; Manufacturer Part Number: BAV21W-7-F; RoHS: RoHS Compliant; Category: Discrete Semiconductor Products; Stock 1: 45564; Pricing 1: 1=0.19, 10=0.169, 100=0.0921, 500=0.05668, 1000=0.03864 (USD); Packaging: Cut Tape (CT); Part Status: Active; Voltage - DC Reverse (Vr) (Max): 200V; Current - Average Rectified (Io): 200mA; Mounting Type: Surface Mount; Package / Case: SOD-123; Supplier Device Package: SOD-123; Operating Temperature - Junction: -65°C ~ 150°C; ComponentLink1URL: http://www.diodes.com/_files/datasheets/ds12024.pdf; ComponentLink1Description: http://www.diodes.com/_files/datasheets/ds12024.pdf; Supplier 2: Mouser; Stock 2: 12019; Pricing 2: 1=0.190, 10=0.176, 100=0.062, 1000=0.041, 3000=0.032, 9000=0.027, 24000=0.025, 45000=0.022, 99000=0.018 (USD); Height: 1.35 mm; Length: 2.85 mm; Operating Temperature Range: - 65 C to + 150 C; Product: Switching Diodes; Series: BAV21; Width: 1.7 mm; Brand: Diodes Incorporated; Mounting Style: SMD/SMT; Maximum Operating Temperature: + 150 C; Minimum Operating Temperature: - 65 C; Peak Reverse Voltage: 200 V; Standard Pack Qty: 3000; RoHS - Mouser: Y; Minimum Order Quantity: 1; Reeling: True; ComponentLink2URL: http://www.mouser.com/ds/2/115/ds12024-82716.pdf; ComponentLink2Description: http://www.mouser.com/ds/2/115/ds12024-82716.pdf; Supplier Part Number 1: BAV21W-FDICT-ND; Supplier Part Number 2: 621-BAV21W-F
footprint SOD-123
pins: 1 A, 2 K

## DFLR1600-7
designator D?